# Altium footprint library LimeMicroAltiumLib_pcbLib.PcbLib: 281 footprints (part 5 of 18)
Each footprint in its own frame and in the unit in brackets; x right, y up, seen from the top. Pads: shape width x height; smd on the part's side, far side on the other; paste and mask are expansions set on the pad; w line width, h text height; cw(c..) or ccw(c..) is an arc to the next point about the centre after c.
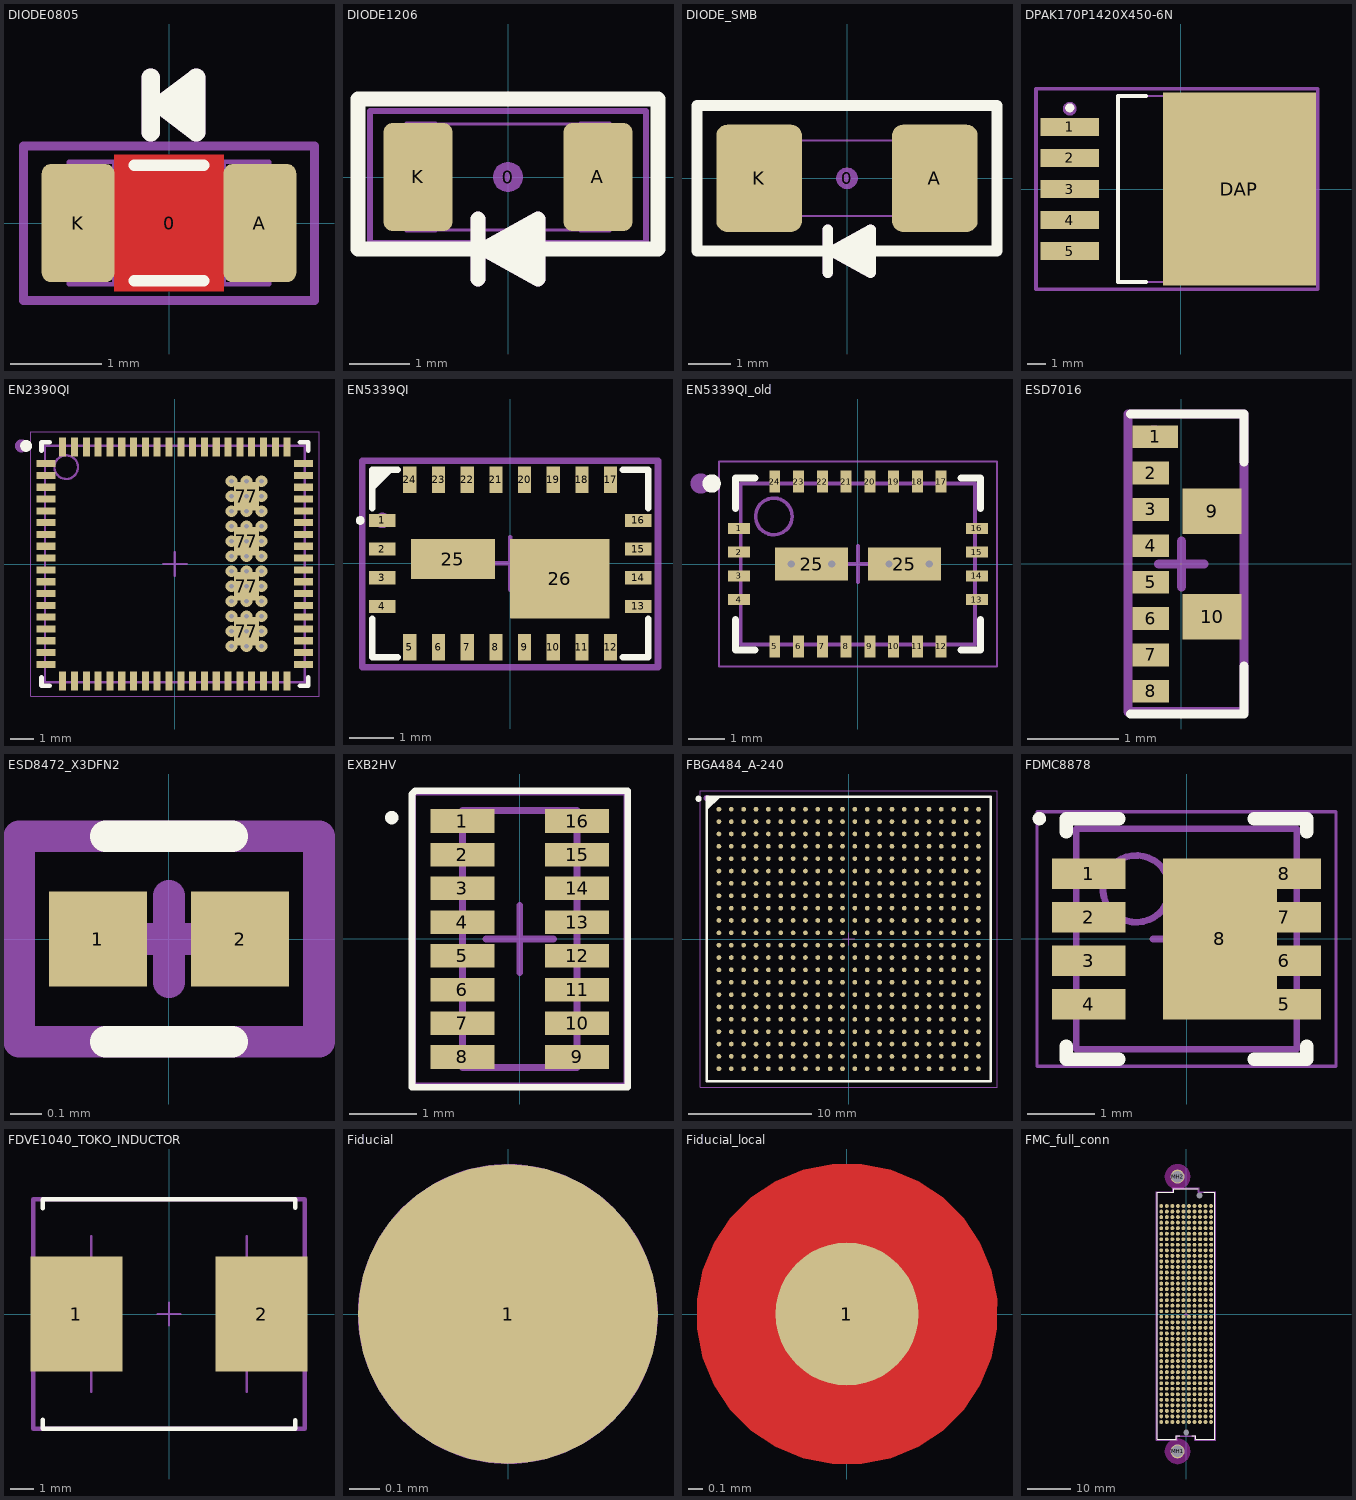
[diagram p4: the footprints below, top view; thin cyan lines are the x and y axes]

## DIODE0805 [mm] "Chip Resistor, Body 2.0x1.2mm, 0805, IPC Medium Density"
height 0.7
pads (3):
  round 0.254 on Mech15: 0(0,0)
  rrect25% 0.8x1.3 smd: A(1,0) K(-1,0)
Top Layer:
  pour cut-out: -0.6,0.75 0.6,0.75 0.6,-0.75 -0.6,-0.75
Top Overlay:
  lines w0.127: -0.381,-0.635 0.381,-0.635 ; -0.381,0.635 0.381,0.635
  lines w0.2: -0.2,1 -0.2,1.6 ; -0.1,1.3 0.3,1 0.3,1.6 ; -0.1,1.3 0.3,1.6 ; -0.1,1.3 0.3,1.3 0.3,1.6
Mechanical 13:
  lines w0.05: 0.6,-0.674 -0.6,-0.674 ; -0.6,-0.675 -0.6,0.675 -1.1,0.675 -1.1,-0.675 -0.6,-0.675 ; -0.6,-0.674 0.6,-0.674 ; 0.6,-0.675 0.6,0.675 ; 0.6,-0.675 1.1,-0.675 1.1,0.675 0.6,0.675 ; 0.6,0.674 -0.6,0.674 0.6,0.674
Mechanical 15:
  lines w0.1: -1.6,-0.85 1.6,-0.85 1.6,0.85 -1.6,0.85 -1.6,-0.85
  lines w0.2: -0.2,1 -0.2,1.6 ; -0.1,1.3 0.3,1.3 0.3,1.6 ; -0.1,1.3 0.3,1.6 ; -0.1,1.3 0.3,1 0.3,1.6
  text ".Designator" at 0,0 h0.7
  text "A" at 0.7,-0.3 h0.9
  text "C" at -1.3,-0.4 h0.9
3D body "RES 0805 (2012 metric).STEP": height 0.69, standoff -0.01, extent -1.1,-0.675 1.1,0.675

## DIODE1206 [mm]
height 1.6
pads (3):
  round 0.508 on Mech15: 0(0,0)
  rrect25% 1.15x1.8 smd: A(1.5,0) K(-1.5,0)
Top Overlay:
  lines w0.254: -0.5,-1.7 -0.5,-0.7 ; 0,-1.4 0.5,-1.4 ; 0.1,-1 0.5,-1 ; 0.5,-1.2 0.3,-1.2 -0.4,-1.2 ; -0.4,-1.2 0.5,-1.7 0.5,-0.7 -0.4,-1.2 ; -2.5,-1.2 -2.5,1.3 2.5,1.3 2.5,-1.2 -2.5,-1.2
Mechanical 13:
  lines w0.05: -1.2,-0.88 1.2,-0.88 ; -1.2,0.88 1.2,0.88 ; -1.7,-0.9 -1.7,0.9 -1.2,0.9 -1.2,-0.9 -1.7,-0.9 ; 1.2,-0.9 1.2,0.9 1.7,0.9 1.7,-0.9 1.2,-0.9
Mechanical 15:
  lines w0.1: -2.3,-1.1 2.3,-1.1 2.3,1.1 -2.3,1.1 -2.3,-1.1
  lines w0.254: -0.5,-1.7 -0.5,-0.7 ; 0,-1.4 0.5,-1.4 ; 0.1,-1 0.5,-1 ; 0.5,-1.2 0.3,-1.2 -0.4,-1.2 ; -0.4,-1.2 0.5,-0.7 0.5,-1.7 -0.4,-1.2
  text ".Designator" at 0,0 h0.7
3D body "CAP_1206.STEP": height 1.74, standoff -0.01, extent -1.7,-0.9 1.7,0.9

## DIODE_SMB [mm]
height 1.6
pads (3):
  round 0.508 on Mech15: 0(0,0)
  rrect25% 2x2.5 smd: A(2.05,0) K(-2.05,0)
Top Overlay:
  lines w0.254: -0.45,-2.2 -0.45,-1.2 ; 0.05,-1.9 0.55,-1.9 ; 0.15,-1.5 0.55,-1.5 ; 0.55,-1.7 0.35,-1.7 -0.35,-1.7 ; -0.35,-1.7 0.55,-1.2 0.55,-2.2 -0.35,-1.7 ; -3.5,-1.7 3.5,-1.7 3.5,1.7 -3.5,1.7 -3.5,-1.7
Mechanical 13:
  lines w0.05: -1.2,-0.88 1.2,-0.88 ; -1.2,0.88 1.2,0.88 ; -1.7,-0.9 -1.2,-0.9 -1.2,0.9 -1.7,0.9 -1.7,-0.9 ; 1.2,-0.9 1.7,-0.9 1.7,0.9 1.2,0.9 1.2,-0.9
Mechanical 15:
  lines w0.1: -3.5,-1.7 -3.5,1.7 3.5,1.7 3.5,-1.7 -3.5,-1.7
  lines w0.254: -0.45,-2.2 -0.45,-1.2 ; 0.05,-1.9 0.55,-1.9 ; 0.15,-1.5 0.55,-1.5 ; 0.55,-1.7 0.35,-1.7 -0.35,-1.7 ; -0.35,-1.7 0.55,-2.2 0.55,-1.2 -0.35,-1.7
  text ".Designator" at 0,0 h0.7
  text "C" at -2.2,-0.5 h0.9
  text "A" at 1.7,-0.5 h0.9
3D body "DO-214AA.STEP": height 2.62, standoff 0, extent -2.7,-2 2.9,1.95

## DPAK170P1420X450-6N [mm] "D2-PAK, 6-Pads, Body 7,75x8,46mm (max), IPC Medium Density"
height 4.5
pads (6):
  rect 3.2x1 smd: 1(-6.1,3.4) 2(-6.1,1.7) 3(-6.1,0) 4(-6.1,-1.7) 5(-6.1,-3.4)
  rect 8.38x10.6 smd: DAP(3.2,0)
Top Overlay:
  circle w0.25: c-6.1,4.45 r0.125
  lines w0.2: -1.9,-5.1 -3.45,-5.1 -3.45,5.1 -1.9,5.1
Mechanical 13:
  lines w0.1: -3.45,-5.1 -3.45,5.1 5.85,5.1 5.85,-5.1 -3.45,-5.1
Mechanical 15:
  circle w0.35: c-6.1,4.4 r0.2
  lines w0.1: -0.5,0 0.5,0 ; 0,-0.5 0,0.5
  lines w0.2: -7.95,-5.5 -7.95,5.5 7.5,5.5 7.5,-5.5 -7.95,-5.5
  text ".Designator" at 0,0 h0.7
3D body: height 4.5, standoff 0, extent -3.45,-5.1 5.85,5.1

## EN2390QI [mm] "QFN, 76-Leads, Body 10,00x11,00mm, Pitch 0,50mm, Thermal Pad 1,20x1,05mm, IPC Medium Density"
height 3
pads (80):
  rect 0.8x0.3 smd: 1(-5.45,4.25) 2(-5.45,3.75) 3(-5.45,3.25) 4(-5.45,2.75) 5(-5.45,2.25) 6(-5.45,1.75) 7(-5.45,1.25) 8(-5.45,0.75) 9(-5.45,0.25) 10(-5.45,-0.25) 11(-5.45,-0.75) 12(-5.45,-1.25) 13(-5.45,-1.75) 14(-5.45,-2.25) 15(-5.45,-2.75) 16(-5.45,-3.25) 17(-5.45,-3.75) 18(-5.45,-4.25) 39(5.45,-4.25) 40(5.45,-3.75) 41(5.45,-3.25) 42(5.45,-2.75) 43(5.45,-2.25) 44(5.45,-1.75) 45(5.45,-1.25) 46(5.45,-0.75) 47(5.45,-0.25) 48(5.45,0.25) 49(5.45,0.75) 50(5.45,1.25) 51(5.45,1.75) 52(5.45,2.25) 53(5.45,2.75) 54(5.45,3.25) 55(5.45,3.75) 56(5.45,4.25)
  rect 0.3x0.8 smd: 19(-4.75,-4.95) 20(-4.25,-4.95) 21(-3.75,-4.95) 22(-3.25,-4.95) 23(-2.75,-4.95) 24(-2.25,-4.95) 25(-1.75,-4.95) 26(-1.25,-4.95) 27(-0.75,-4.95) 28(-0.25,-4.95) 29(0.25,-4.95) 30(0.75,-4.95) 31(1.25,-4.95) 32(1.75,-4.95) 33(2.25,-4.95) 34(2.75,-4.95) 35(3.25,-4.95) 36(3.75,-4.95) 37(4.25,-4.95) 38(4.75,-4.95) 57(4.75,4.95) 58(4.25,4.95) 59(3.75,4.95) 60(3.25,4.95) 61(2.75,4.95) 62(2.25,4.95) 63(1.75,4.95) 64(1.25,4.95) 65(0.75,4.95) 66(0.25,4.95) 67(-0.25,4.95) 68(-0.75,4.95) 69(-1.25,4.95) 70(-1.75,4.95) 71(-2.25,4.95) 72(-2.75,4.95) 73(-3.25,4.95) 74(-3.75,4.95) 75(-4.25,4.95) 76(-4.75,4.95)
  rect 1.05x1.2 smd: 77(3.029,-2.844) 77(3.029,-0.939) 77(3.029,0.966) 77(3.029,2.871)
via 3.029,2.871 diameter 0.5 hole 0.2
via 2.394,2.871 diameter 0.5 hole 0.2
via 2.394,2.236 diameter 0.5 hole 0.2
via 3.029,2.236 diameter 0.5 hole 0.2
via 3.664,2.236 diameter 0.5 hole 0.2
via 3.664,2.871 diameter 0.5 hole 0.2
via 3.664,3.506 diameter 0.5 hole 0.2
via 3.029,3.506 diameter 0.5 hole 0.2
via 2.394,3.506 diameter 0.5 hole 0.2
via 2.394,1.601 diameter 0.5 hole 0.2
via 3.029,1.601 diameter 0.5 hole 0.2
via 3.664,1.601 diameter 0.5 hole 0.2
via 3.664,0.966 diameter 0.5 hole 0.2
via 3.664,0.331 diameter 0.5 hole 0.2
via 3.029,0.331 diameter 0.5 hole 0.2
via 2.394,0.331 diameter 0.5 hole 0.2
via 2.394,0.966 diameter 0.5 hole 0.2
via 3.029,0.966 diameter 0.5 hole 0.2
via 2.394,-0.304 diameter 0.5 hole 0.2
via 3.029,-0.304 diameter 0.5 hole 0.2
via 3.664,-0.304 diameter 0.5 hole 0.2
via 3.664,-0.939 diameter 0.5 hole 0.2
via 3.664,-1.574 diameter 0.5 hole 0.2
via 3.029,-1.574 diameter 0.5 hole 0.2
via 2.394,-1.574 diameter 0.5 hole 0.2
via 2.394,-0.939 diameter 0.5 hole 0.2
via 3.029,-0.939 diameter 0.5 hole 0.2
via 2.394,-2.209 diameter 0.5 hole 0.2
via 3.029,-2.209 diameter 0.5 hole 0.2
via 3.664,-2.209 diameter 0.5 hole 0.2
via 3.664,-2.844 diameter 0.5 hole 0.2
via 3.664,-3.479 diameter 0.5 hole 0.2
via 3.029,-3.479 diameter 0.5 hole 0.2
via 2.394,-3.479 diameter 0.5 hole 0.2
via 2.394,-2.844 diameter 0.5 hole 0.2
via 3.029,-2.844 diameter 0.5 hole 0.2
Top Overlay:
  circle w0.25: c-6.3,5 r0.125
  lines w0.2: -5.65,-4.8 -5.65,-5.15 -5.3,-5.15 ; -5.65,4.8 -5.65,5.15 -5.3,5.15 ; 5.3,-5.15 5.65,-5.15 5.65,-4.8 ; 5.3,5.15 5.65,5.15 5.65,4.8
Mechanical 13:
  circle w0.1: c-4.6,4.1 r0.5
  lines w0.1: -5.5,-5 5.5,-5 5.5,5 -5.5,5 -5.5,-5
Mechanical 15:
  circle w0.35: c-6.5,5 r0.1
  lines w0.05: -6.1,-5.6 6.1,-5.6 6.1,5.6 -6.1,5.6 -6.1,-5.6
  lines w0.1: -0.5,0 0.5,0 ; 0,-0.5 0,0.5
  text ".Designator" at 0,0 h0.7
3D body: height 3, standoff 0.01, extent -5.5,-5 5.5,5

## EN5339QI [mm] "EN5339QI"
pads (26):
  rect 0.6x0.3 smd mask+0.1: 1(-2.9,0.975) 2(-2.9,0.325) 3(-2.9,-0.325) 4(-2.9,-0.975) 13(2.9,-0.975) 14(2.9,-0.325) 15(2.9,0.325) 16(2.9,0.975)
  rect 0.3x0.6 smd mask+0.1: 5(-2.275,-1.9) 6(-1.625,-1.9) 7(-0.975,-1.9) 8(-0.325,-1.9) 9(0.325,-1.9) 10(0.975,-1.9) 11(1.625,-1.9) 12(2.275,-1.9) 17(2.275,1.9) 18(1.625,1.9) 19(0.975,1.9) 20(0.325,1.9) 21(-0.325,1.9) 22(-0.975,1.9) 23(-1.625,1.9) 24(-2.275,1.9)
  rect 1.9x0.9 smd mask+0.1: 25(-1.3,0.1)
  rect 2.25x1.8 smd mask+0.1: 26(1.125,-0.35)
Top Overlay:
  circle w0.1: c-3.4,0.975 r0.05
  region: -3.125,2.125 -3.125,1.625 -2.625,2.125
  lines w0.15: -3.125,-1.25 -3.125,-2.125 -2.55,-2.125 ; -3.125,1.25 -3.125,2.125 -2.55,2.125 ; 2.55,-2.125 3.125,-2.125 3.125,-1.25 ; 2.55,2.125 3.125,2.125 3.125,1.25
Top Solder:
  region: -0.3,-0.45 -0.3,0.65 -0.05,0.65 -0.05,-0.45
Mechanical 15:
  circle w0.2: c-2.9,0.975 r0.075
  lines w0.1: -0.6,0 0,0 ; 0,-0.6 0,0 ; 0,0.6 0,0 ; 0.6,0 0,0
  lines w0.15: -3.35,-2.35 -3.35,2.325 3.35,2.325 3.35,-2.35 -3.35,-2.35
  text ".Designator" at 0,0 h0.55
3D body: height 1.11, standoff 1.1, extent -2.775,0.775 -2.375,1.175
3D body: height 1.1, standoff 0, extent -3,-2 3,2

## EN5339QI_old [mm] "QFN, 24-Leads, Body 4,40x6,40mm, Pitch 0,65mm, Thermal Pad 0,90x2,00mm, IPC Medium Density"
height 1.1
pads (26):
  rect 0.6x0.3 smd: 1(-3.25,0.975) 2(-3.25,0.325) 3(-3.25,-0.325) 4(-3.25,-0.975) 13(3.25,-0.975) 14(3.25,-0.325) 15(3.25,0.325) 16(3.25,0.975)
  rect 0.3x0.6 smd: 5(-2.275,-2.25) 6(-1.625,-2.25) 7(-0.975,-2.25) 8(-0.325,-2.25) 9(0.325,-2.25) 10(0.975,-2.25) 11(1.625,-2.25) 12(2.275,-2.25) 17(2.275,2.25) 18(1.625,2.25) 19(0.975,2.25) 20(0.325,2.25) 21(-0.325,2.25) 22(-0.975,2.25) 23(-1.625,2.25) 24(-2.275,2.25)
  rect 2x0.9 smd: 25(-1.27,0) 25(1.27,0)
via -0.72,0 diameter 0.5 hole 0.2
via -1.82,0 diameter 0.5 hole 0.2
via 1.947,0 diameter 0.5 hole 0.2
via 0.847,0 diameter 0.5 hole 0.2
Top Overlay:
  circle w0.25: c-4,2.2 r0.125
  lines w0.2: -3.35,-1.525 -3.35,-2.35 -2.825,-2.35 ; -3.35,1.525 -3.35,2.35 -2.825,2.35 ; 2.825,-2.35 3.35,-2.35 3.35,-1.525 ; 2.825,2.35 3.35,2.35 3.35,1.525
Mechanical 13:
  circle w0.1: c-2.3,1.3 r0.5
  lines w0.1: -3.2,-2.2 -3.2,2.2 3.2,2.2 3.2,-2.2 -3.2,-2.2
Mechanical 15:
  circle w0.35: c-4.3,2.2 r0.1
  lines w0.05: -3.8,-2.8 -3.8,2.8 3.8,2.8 3.8,-2.8 -3.8,-2.8
  lines w0.1: -0.5,0 0.5,0 ; 0,-0.5 0,0.5
  text ".Designator" at 0,0 h0.7
3D body: height 1.1, standoff 0.01, extent -3.2,-2.2 3.2,2.2

## ESD7016 [mm]
pads (10):
  rect 0.5x0.25 smd mask+0.05: 1(-0.287,1.4)
  rect 0.4x0.25 smd mask+0.05: 2(-0.337,1) 3(-0.337,0.6) 4(-0.337,0.2) 5(-0.337,-0.2) 6(-0.337,-0.6) 7(-0.337,-1) 8(-0.337,-1.4)
  rect 0.65x0.5 smd mask+0.05: 9(0.337,0.58) 10(0.337,-0.58)
Top Overlay:
  lines w0.1: -0.562,-1.65 0.688,-1.65 0.688,-1.125 ; -0.562,1.65 0.688,1.65 0.688,1.125
Mechanical 15:
  circle w0.2: c-0.3,1.4 r0.025
  lines w0.1: -0.25,0 0,0 ; 0,-0.25 0,0 ; 0,0.25 0,0 ; 0.25,0 0,0 ; -0.587,-1.625 -0.587,1.65 0.688,1.65 0.688,-1.625 -0.587,-1.625
  text ".Designator" at 0,0 h0.55

## ESD8472_X3DFN2 [mm]
pads (2):
  rect 0.31x0.3 smd mask+0.05: 1(-0.225,0) 2(0.225,0)
Top Overlay:
  lines w0.1: -0.2,-0.325 0.2,-0.325 ; -0.2,0.325 0.2,0.325
Mechanical 15:
  lines w0.1: -0.138,0 0.138,0 ; 0,-0.138 0,0.138 ; -0.475,-0.325 0.475,-0.325 0.475,0.325 -0.475,0.325 -0.475,-0.325
  text ".Designator" at 0,0 h0.55

## EXB2HV [mm] "Chip Array, Flat, 16-Leads, Pitch 0,50mm,  Body 3,80x1,60mm,  IPC Medium Density"
height 1
pads (16):
  rect 0.95x0.35 smd mask+0.05: 1(-0.85,1.75) 2(-0.85,1.25) 3(-0.85,0.75) 4(-0.85,0.25) 5(-0.85,-0.25) 6(-0.85,-0.75) 7(-0.85,-1.25) 8(-0.85,-1.75) 9(0.85,-1.75) 10(0.85,-1.25) 11(0.85,-0.75) 12(0.85,-0.25) 13(0.85,0.25) 14(0.85,0.75) 15(0.85,1.25) 16(0.85,1.75)
Top Overlay:
  circle w0.1: c-1.9,1.8 r0.05
  lines w0.1: -1.6,-2.2 1.6,-2.2 1.6,2.2 -1.55,2.2 -1.6,2.15 -1.6,-2.2
Mechanical 13:
  lines w0.1: -0.85,-1.905 0.85,-1.905 0.85,1.905 -0.85,1.905 -0.85,-1.905
Mechanical 15:
  lines w0.05: -1.565,-2.155 1.565,-2.155 1.565,2.155 -1.565,2.155 -1.565,-2.155
  lines w0.1: -0.5,0 0.5,0 ; 0,-0.5 0,0.5
  text ".Designator" at 0,0 h0.7
3D body "User Library-YC248-1.step": height 0.45, standoff 0, extent -0.8,-2 0.8,2

## FBGA484_A-240 [mm] "BGA, 484-Leads, Body 23x23mm, Pitch 1mm"
height 2.4
pads (484):
  round 0.38 smd: A1(-10.5,10.5) A2(-9.5,10.5) A3(-8.5,10.5) A4(-7.5,10.5) A5(-6.5,10.5) A6(-5.5,10.5) A7(-4.5,10.5) A8(-3.5,10.5) A9(-2.5,10.5) A10(-1.5,10.5) A11(-0.5,10.5) A12(0.5,10.5) A13(1.5,10.5) A14(2.5,10.5) A15(3.5,10.5) A16(4.5,10.5) A17(5.5,10.5) A18(6.5,10.5) A19(7.5,10.5) A20(8.5,10.5) A21(9.5,10.5) A22(10.5,10.5) AA1(-10.5,-9.5) AA2(-9.5,-9.5) AA3(-8.5,-9.5) AA4(-7.5,-9.5) AA5(-6.5,-9.5) AA6(-5.5,-9.5) AA7(-4.5,-9.5) AA8(-3.5,-9.5) AA9(-2.5,-9.5) AA10(-1.5,-9.5) AA11(-0.5,-9.5) AA12(0.5,-9.5) AA13(1.5,-9.5) AA14(2.5,-9.5) AA15(3.5,-9.5) AA16(4.5,-9.5) AA17(5.5,-9.5) AA18(6.5,-9.5) AA19(7.5,-9.5) AA20(8.5,-9.5) AA21(9.5,-9.5) AA22(10.5,-9.5) AB1(-10.5,-10.5) AB2(-9.5,-10.5) AB3(-8.5,-10.5) AB4(-7.5,-10.5) AB5(-6.5,-10.5) AB6(-5.5,-10.5) AB7(-4.5,-10.5) AB8(-3.5,-10.5) AB9(-2.5,-10.5) AB10(-1.5,-10.5) AB11(-0.5,-10.5) AB12(0.5,-10.5) AB13(1.5,-10.5) AB14(2.5,-10.5) AB15(3.5,-10.5) AB16(4.5,-10.5) AB17(5.5,-10.5) AB18(6.5,-10.5) AB19(7.5,-10.5) AB20(8.5,-10.5) AB21(9.5,-10.5) AB22(10.5,-10.5) B1(-10.5,9.5) B2(-9.5,9.5) B3(-8.5,9.5) B4(-7.5,9.5) B5(-6.5,9.5) B6(-5.5,9.5) B7(-4.5,9.5) B8(-3.5,9.5) B9(-2.5,9.5) B10(-1.5,9.5) B11(-0.5,9.5) B12(0.5,9.5) B13(1.5,9.5) B14(2.5,9.5) B15(3.5,9.5) B16(4.5,9.5) B17(5.5,9.5) B18(6.5,9.5) B19(7.5,9.5) B20(8.5,9.5) B21(9.5,9.5) B22(10.5,9.5) C1(-10.5,8.5) C2(-9.5,8.5) C3(-8.5,8.5) C4(-7.5,8.5) C5(-6.5,8.5) C6(-5.5,8.5) C7(-4.5,8.5) C8(-3.5,8.5) C9(-2.5,8.5) C10(-1.5,8.5) C11(-0.5,8.5) C12(0.5,8.5) C13(1.5,8.5) C14(2.5,8.5) C15(3.5,8.5) C16(4.5,8.5) C17(5.5,8.5) C18(6.5,8.5) C19(7.5,8.5) C20(8.5,8.5) C21(9.5,8.5) C22(10.5,8.5) D1(-10.5,7.5) D2(-9.5,7.5) D3(-8.5,7.5) D4(-7.5,7.5) D5(-6.5,7.5) D6(-5.5,7.5) D7(-4.5,7.5) D8(-3.5,7.5) D9(-2.5,7.5) D10(-1.5,7.5) D11(-0.5,7.5) D12(0.5,7.5) D13(1.5,7.5) D14(2.5,7.5) D15(3.5,7.5) D16(4.5,7.5) D17(5.5,7.5) D18(6.5,7.5) D19(7.5,7.5) D20(8.5,7.5) D21(9.5,7.5) D22(10.5,7.5) E1(-10.5,6.5) E2(-9.5,6.5) E3(-8.5,6.5) E4(-7.5,6.5) E5(-6.5,6.5) E6(-5.5,6.5) E7(-4.5,6.5) E8(-3.5,6.5) E9(-2.5,6.5) E10(-1.5,6.5) E11(-0.5,6.5) E12(0.5,6.5) E13(1.5,6.5) E14(2.5,6.5) E15(3.5,6.5) E16(4.5,6.5) E17(5.5,6.5) E18(6.5,6.5) E19(7.5,6.5) E20(8.5,6.5) E21(9.5,6.5) E22(10.5,6.5) F1(-10.5,5.5) F2(-9.5,5.5) F3(-8.5,5.5) F4(-7.5,5.5) F5(-6.5,5.5) F6(-5.5,5.5) F7(-4.5,5.5) F8(-3.5,5.5) F9(-2.5,5.5) F10(-1.5,5.5) F11(-0.5,5.5) F12(0.5,5.5) F13(1.5,5.5) F14(2.5,5.5) F15(3.5,5.5) F16(4.5,5.5) F17(5.5,5.5) F18(6.5,5.5) F19(7.5,5.5) F20(8.5,5.5) F21(9.5,5.5) F22(10.5,5.5) G1(-10.5,4.5) G2(-9.5,4.5) G3(-8.5,4.5) G4(-7.5,4.5) G5(-6.5,4.5) G6(-5.5,4.5) G7(-4.5,4.5) G8(-3.5,4.5) G9(-2.5,4.5) G10(-1.5,4.5) G11(-0.5,4.5) G12(0.5,4.5) G13(1.5,4.5) G14(2.5,4.5) G15(3.5,4.5) G16(4.5,4.5) G17(5.5,4.5) G18(6.5,4.5) G19(7.5,4.5) G20(8.5,4.5) G21(9.5,4.5) G22(10.5,4.5) H1(-10.5,3.5) H2(-9.5,3.5) H3(-8.5,3.5) H4(-7.5,3.5) H5(-6.5,3.5) H6(-5.5,3.5) H7(-4.5,3.5) H8(-3.5,3.5) H9(-2.5,3.5) H10(-1.5,3.5) H11(-0.5,3.5) H12(0.5,3.5) H13(1.5,3.5) H14(2.5,3.5) H15(3.5,3.5) H16(4.5,3.5) H17(5.5,3.5) H18(6.5,3.5) H19(7.5,3.5) H20(8.5,3.5) H21(9.5,3.5) H22(10.5,3.5) J1(-10.5,2.5) J2(-9.5,2.5) J3(-8.5,2.5) J4(-7.5,2.5) J5(-6.5,2.5) J6(-5.5,2.5) J7(-4.5,2.5) J8(-3.5,2.5) J9(-2.5,2.5) J10(-1.5,2.5) J11(-0.5,2.5) J12(0.5,2.5) J13(1.5,2.5) J14(2.5,2.5) J15(3.5,2.5) J16(4.5,2.5) J17(5.5,2.5) J18(6.5,2.5) J19(7.5,2.5) J20(8.5,2.5) J21(9.5,2.5) J22(10.5,2.5) K1(-10.5,1.5) K2(-9.5,1.5) K3(-8.5,1.5) K4(-7.5,1.5) K5(-6.5,1.5) K6(-5.5,1.5) K7(-4.5,1.5) K8(-3.5,1.5) K9(-2.5,1.5) K10(-1.5,1.5) K11(-0.5,1.5) K12(0.5,1.5) K13(1.5,1.5) K14(2.5,1.5) K15(3.5,1.5) K16(4.5,1.5) K17(5.5,1.5) K18(6.5,1.5) K19(7.5,1.5) K20(8.5,1.5) K21(9.5,1.5) K22(10.5,1.5) L1(-10.5,0.5) L2(-9.5,0.5) L3(-8.5,0.5) L4(-7.5,0.5) L5(-6.5,0.5) L6(-5.5,0.5) L7(-4.5,0.5) L8(-3.5,0.5) L9(-2.5,0.5) L10(-1.5,0.5) L11(-0.5,0.5) L12(0.5,0.5) L13(1.5,0.5) L14(2.5,0.5) L15(3.5,0.5) L16(4.5,0.5) L17(5.5,0.5) L18(6.5,0.5) L19(7.5,0.5) L20(8.5,0.5) L21(9.5,0.5) L22(10.5,0.5) M1(-10.5,-0.5) M2(-9.5,-0.5) M3(-8.5,-0.5) M4(-7.5,-0.5) M5(-6.5,-0.5) M6(-5.5,-0.5) M7(-4.5,-0.5) M8(-3.5,-0.5) M9(-2.5,-0.5) M10(-1.5,-0.5) M11(-0.5,-0.5) M12(0.5,-0.5) M13(1.5,-0.5) M14(2.5,-0.5) M15(3.5,-0.5) M16(4.5,-0.5) M17(5.5,-0.5) M18(6.5,-0.5) M19(7.5,-0.5) M20(8.5,-0.5) M21(9.5,-0.5) M22(10.5,-0.5) N1(-10.5,-1.5) N2(-9.5,-1.5) N3(-8.5,-1.5) N4(-7.5,-1.5) N5(-6.5,-1.5) N6(-5.5,-1.5) N7(-4.5,-1.5) N8(-3.5,-1.5) N9(-2.5,-1.5) N10(-1.5,-1.5) N11(-0.5,-1.5) N12(0.5,-1.5) N13(1.5,-1.5) N14(2.5,-1.5) N15(3.5,-1.5) N16(4.5,-1.5) N17(5.5,-1.5) N18(6.5,-1.5) N19(7.5,-1.5) N20(8.5,-1.5) N21(9.5,-1.5) N22(10.5,-1.5) P1(-10.5,-2.5) P2(-9.5,-2.5) P3(-8.5,-2.5) P4(-7.5,-2.5) P5(-6.5,-2.5) P6(-5.5,-2.5) P7(-4.5,-2.5) P8(-3.5,-2.5) P9(-2.5,-2.5) P10(-1.5,-2.5) P11(-0.5,-2.5) P12(0.5,-2.5) P13(1.5,-2.5) P14(2.5,-2.5) P15(3.5,-2.5) P16(4.5,-2.5) P17(5.5,-2.5) P18(6.5,-2.5) P19(7.5,-2.5) P20(8.5,-2.5) P21(9.5,-2.5) P22(10.5,-2.5) R1(-10.5,-3.5) R2(-9.5,-3.5) R3(-8.5,-3.5) R4(-7.5,-3.5) R5(-6.5,-3.5) R6(-5.5,-3.5) R7(-4.5,-3.5) R8(-3.5,-3.5) R9(-2.5,-3.5) R10(-1.5,-3.5) R11(-0.5,-3.5) R12(0.5,-3.5) R13(1.5,-3.5) R14(2.5,-3.5) R15(3.5,-3.5) R16(4.5,-3.5) R17(5.5,-3.5) R18(6.5,-3.5) R19(7.5,-3.5) R20(8.5,-3.5) R21(9.5,-3.5) R22(10.5,-3.5) T1(-10.5,-4.5) T2(-9.5,-4.5) T3(-8.5,-4.5) T4(-7.5,-4.5) T5(-6.5,-4.5) T6(-5.5,-4.5) T7(-4.5,-4.5) T8(-3.5,-4.5) T9(-2.5,-4.5) T10(-1.5,-4.5) T11(-0.5,-4.5) T12(0.5,-4.5) T13(1.5,-4.5) T14(2.5,-4.5) T15(3.5,-4.5) T16(4.5,-4.5) T17(5.5,-4.5) T18(6.5,-4.5) T19(7.5,-4.5) T20(8.5,-4.5) T21(9.5,-4.5) T22(10.5,-4.5) U1(-10.5,-5.5) U2(-9.5,-5.5) U3(-8.5,-5.5) U4(-7.5,-5.5) U5(-6.5,-5.5) U6(-5.5,-5.5) U7(-4.5,-5.5) U8(-3.5,-5.5) U9(-2.5,-5.5) U10(-1.5,-5.5) U11(-0.5,-5.5) U12(0.5,-5.5) U13(1.5,-5.5) U14(2.5,-5.5) U15(3.5,-5.5) U16(4.5,-5.5) U17(5.5,-5.5) U18(6.5,-5.5) U19(7.5,-5.5) U20(8.5,-5.5) U21(9.5,-5.5) U22(10.5,-5.5) V1(-10.5,-6.5) V2(-9.5,-6.5) V3(-8.5,-6.5) V4(-7.5,-6.5) V5(-6.5,-6.5) V6(-5.5,-6.5) V7(-4.5,-6.5) V8(-3.5,-6.5) V9(-2.5,-6.5) V10(-1.5,-6.5) V11(-0.5,-6.5) V12(0.5,-6.5) V13(1.5,-6.5) V14(2.5,-6.5) V15(3.5,-6.5) V16(4.5,-6.5) V17(5.5,-6.5) V18(6.5,-6.5) V19(7.5,-6.5) V20(8.5,-6.5) V21(9.5,-6.5) V22(10.5,-6.5) W1(-10.5,-7.5) W2(-9.5,-7.5) W3(-8.5,-7.5) W4(-7.5,-7.5) W5(-6.5,-7.5) W6(-5.5,-7.5) W7(-4.5,-7.5) W8(-3.5,-7.5) W9(-2.5,-7.5) W10(-1.5,-7.5) W11(-0.5,-7.5) W12(0.5,-7.5) W13(1.5,-7.5) W14(2.5,-7.5) W15(3.5,-7.5) W16(4.5,-7.5) W17(5.5,-7.5) W18(6.5,-7.5) W19(7.5,-7.5) W20(8.5,-7.5) W21(9.5,-7.5) W22(10.5,-7.5) Y1(-10.5,-8.5) Y2(-9.5,-8.5) Y3(-8.5,-8.5) Y4(-7.5,-8.5) Y5(-6.5,-8.5) Y6(-5.5,-8.5) Y7(-4.5,-8.5) Y8(-3.5,-8.5) Y9(-2.5,-8.5) Y10(-1.5,-8.5) Y11(-0.5,-8.5) Y12(0.5,-8.5) Y13(1.5,-8.5) Y14(2.5,-8.5) Y15(3.5,-8.5) Y16(4.5,-8.5) Y17(5.5,-8.5) Y18(6.5,-8.5) Y19(7.5,-8.5) Y20(8.5,-8.5) Y21(9.5,-8.5) Y22(10.5,-8.5)
Top Overlay:
  circle w0.25: c-12.15,11.35 r0.125
  region: -10.5,11.5 -11.5,10.5 -11.5,11.5
  lines w0.2: -11.5,10.5 -10.5,11.5 ; -11.5,-11.5 11.5,-11.5 11.5,11.5 -11.5,11.5 -11.5,-11.5
Mechanical 13:
  lines w0.1: -11.5,-11.5 11.5,-11.5 11.5,11.5 -11.5,11.5 -11.5,-11.5
Mechanical 15:
  circle w0.25: c-11.5,11.4 r0.125
  lines w0.05: -12,-12 12,-12 12,12 -12,12 -12,-12
  lines w0.1: -0.5,0 0.5,0 ; 0,-0.5 0,0.5
  text ".Designator" at 0,0 h0.7
3D body: height 2.4, standoff 0.4, extent -11.5,-11.5 11.5,11.5
3D body: height 2.5, standoff 2.4, extent -10.9,10.1 -10.1,10.9

## FDMC8878 [mm] "SON, 8-Leads, Body 3,30x3,30mm, Pitch 0,65mm, Thermal Pad 1,20x0,75mm, IPC Medium Density"
height 0.8
pads (9):
  rect 1.1x0.45 smd mask+0.05: 1(-1.46,0.975) 2(-1.46,0.325) 3(-1.46,-0.325) 4(-1.46,-0.975)
  rect 1.1x0.45 smd: 5(1.46,-0.975) 6(1.46,-0.325) 7(1.46,0.325) 8(1.46,0.975)
  rect 1.7x2.4 smd: 8(0.5,0)
Top Overlay:
  circle w0.1: c-2.2,1.8 r0.05
  lines w0.2: -1.8,-1.6 -1.8,-1.8 -1.01,-1.8 ; -1.8,1.6 -1.8,1.8 -1.01,1.8 ; 1.01,-1.8 1.8,-1.8 1.8,-1.6 ; 1.01,1.8 1.8,1.8 1.8,1.6
Mechanical 13:
  circle w0.1: c-0.75,0.75 r0.5
  lines w0.1: -1.65,-1.65 1.65,-1.65 1.65,1.65 -1.65,1.65 -1.65,-1.65
Mechanical 15:
  lines w0.05: -2.235,-1.9 2.235,-1.9 2.235,1.9 -2.235,1.9 -2.235,-1.9
  lines w0.1: -0.5,0 0.5,0 ; 0,-0.5 0,0.5
  text ".Designator" at 0,0 h0.7
3D body: height 0.8, standoff 0.2, extent -1.65,-1.65 1.65,1.65
